# Altium footprint library 10-Diobe.PcbLib: 108 footprints (part 1 of 7)
Each footprint in its own frame and in the unit in brackets; x right, y up, seen from the top. Pads: shape width x height; smd on the part's side, far side on the other; paste and mask are expansions set on the pad; w line width, h text height; cw(c..) or ccw(c..) is an arc to the next point about the centre after c.
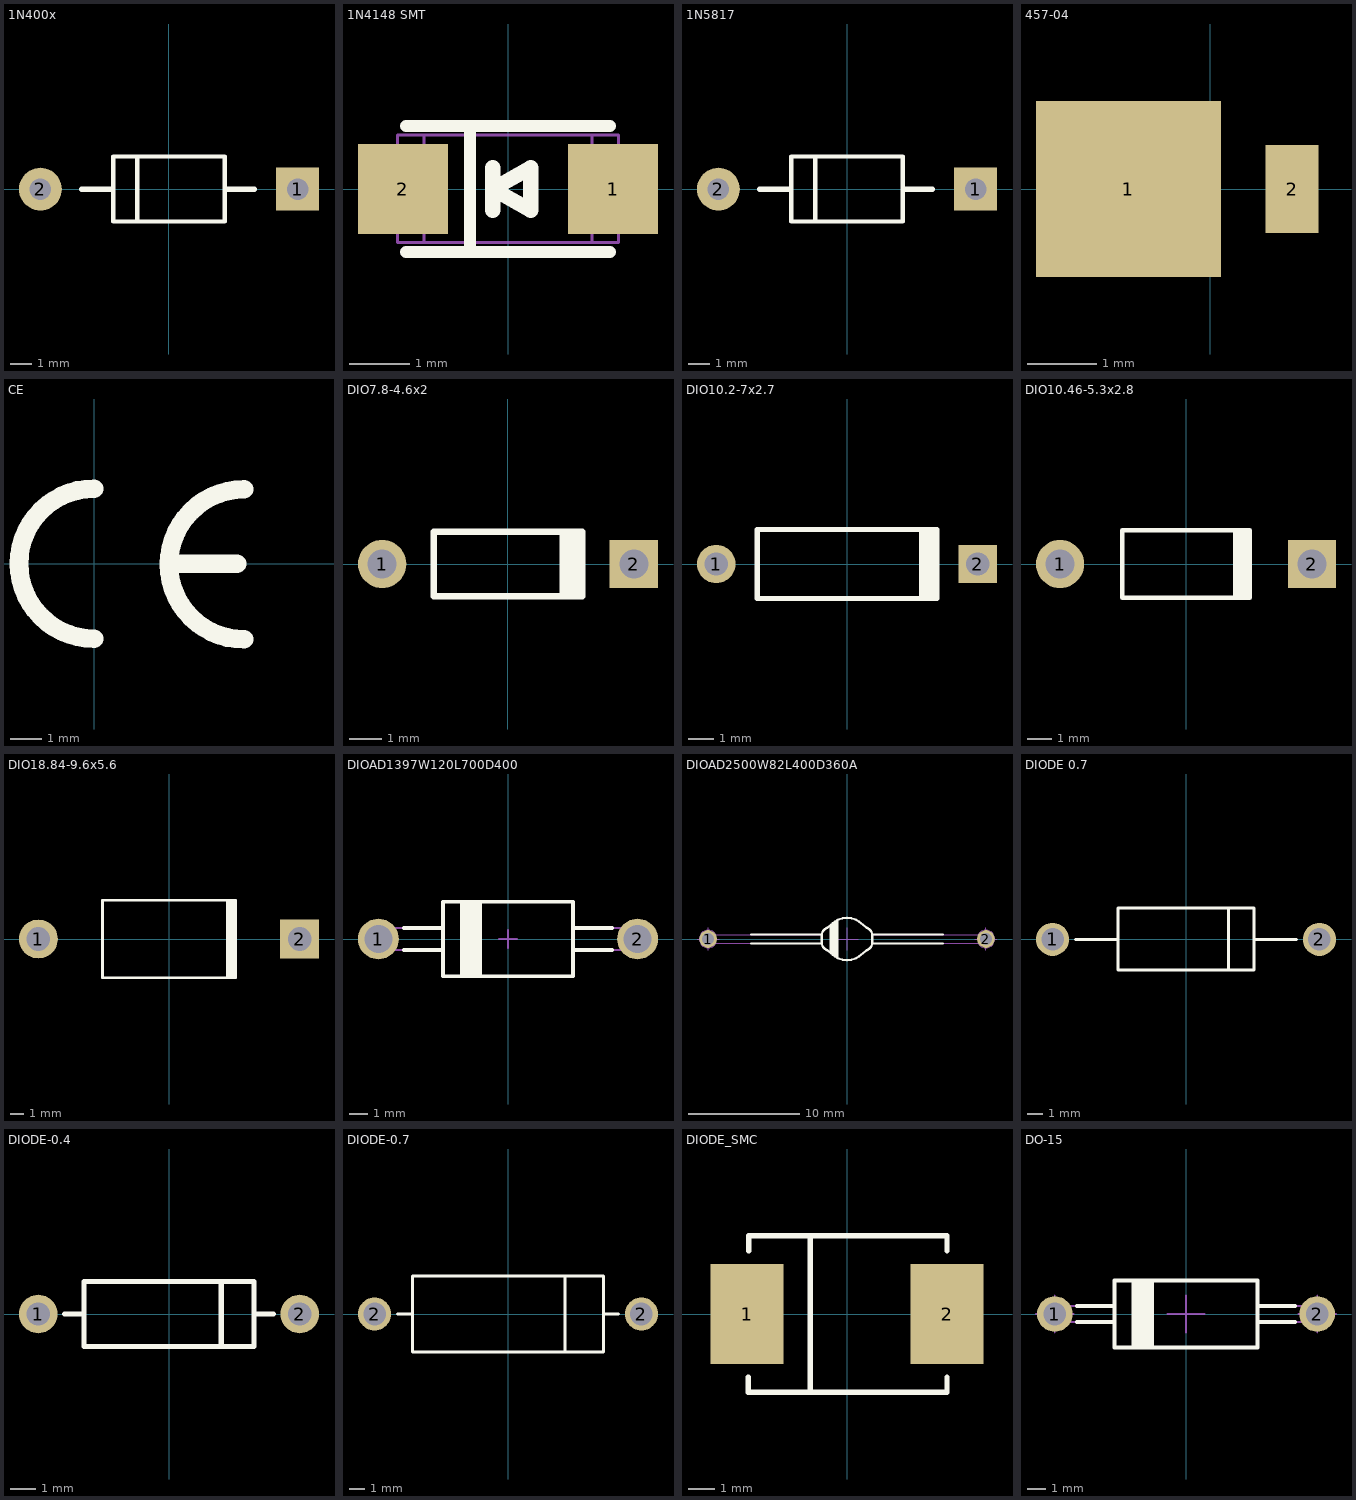
[diagram p0: the footprints below, top view; thin cyan lines are the x and y axes]

## 1N400x [mm]
height 5.98
pads (2):
  rect 2x2 hole 1: 1(6,0)
  round 2 hole 1 mask+0.07: 2(-6,0)
Top Overlay:
  lines w0.2: -1.486,-1.499 -1.486,1.524 ; -2.6,-1.511 -2.6,1.524 2.6,1.524 2.6,-1.511 -2.6,-1.511
  lines w0.254: -4.077,0 -2.654,0 ; 2.616,0 3.975,0
3D body "d12.stp": height 3.01, standoff -1.5, extent -6.5,-1.505 6.5,1.505
3D body "2-2-0_8.stp": height 0.02, standoff -2.02, extent 4.994,-0.978 6.994,1.022
3D body "2-2-0_8.stp": height 0.02, standoff -2.02, extent -6.994,-0.978 -4.994,1.022

## 1N4148 SMT [mm]
height 5.98
pads (2):
  rect 1.5x1.5 smd: 1(1.75,0)
  rect 1.5x1.5 smd mask+0.07: 2(-1.75,0)
Top Overlay:
  lines w0.2: -1.7,-1.05 1.7,-1.05 ; -1.7,1.05 1.7,1.05 ; -0.635,-1.05 -0.635,1.05
  lines w0.254: -0.254,-0.356 -0.254,0 ; -0.254,0.356 -0.254,0 ; -0.254,0 0.381,0.356 0.381,-0.356 -0.254,0
Mechanical 15:
  lines w0.051: -1.397,-0.889 -1.397,0.902 ; 1.397,-0.889 1.397,0.902 ; -1.841,-0.889 1.841,-0.889 1.841,0.902 -1.841,0.902 -1.841,-0.889
3D body "1_5-1_5.stp": height 0.01, standoff 0, extent 1,-0.75 2.5,0.75
3D body "1_5-1_5.stp": height 0.01, standoff 0, extent -2.5,-0.75 -1,0.75
3D body "1n4148-smt.stp": height 1.6, standoff 0, extent -1.8,-0.815 1.8,0.789

## 1N5817 [mm]
height 5.98
pads (2):
  rect 2x2 hole 1: 1(6,0)
  round 2 hole 1 mask+0.07: 2(-6,0)
Top Overlay:
  lines w0.2: -1.486,-1.499 -1.486,1.524 ; -2.6,-1.511 2.6,-1.511 2.6,1.524 -2.6,1.524 -2.6,-1.511
  lines w0.254: -4.077,0 -2.654,0 ; 2.616,0 3.975,0
3D body "2-2-0_8.stp": height 0.02, standoff -2.02, extent -6.994,-0.978 -4.994,1.022
3D body "2-2-0_8.stp": height 0.02, standoff -2.02, extent 4.994,-0.978 6.994,1.022
3D body "d12.stp": height 3.01, standoff -1.5, extent -6.5,-1.505 6.5,1.505

## 457-04 [mil]
height 235.43
pads (2):
  rect 105.12x100 smd: 1(-46.5,0)
  rect 30x50 smd mask+2.76: 2(46.5,0)
3D body "1_27-0_762.stp": height 0.79, standoff 0, extent 31.5,-25 61.5,25
3D body "457-04.stp": height 33.46, standoff 0, extent -87.14,-34.44 48.69,34.45
3D body "2_67-2_54.stp": height 0.79, standoff 0, extent -99.05,-50 6.06,50

## CE [mm]
Top Overlay:
  lines w0.6: 0,-2.413 cw(c0,0) 0,2.413 ; 2.53,0 4.6,0 ; 4.826,-2.438 cw(c4.826,-0.025) 4.826,2.388
3D body "ce.stp": height 0.02, standoff 0, extent -2.725,-2.725 4.82,2.725

## DIO7.8-4.6x2 [mm] "Diode, Axial; Body 4.6 x 1.9 mm (LxDia. max), Lead Dia. 0.53 mm (max)"
height 2
pads (2):
  round 1.5 hole 0.9 mask+0.07: 1(-3.9,0)
  rect 1.5x1.5 hole 0.9 mask+0.07: 2(3.9,0)
Top Overlay:
  rectangle: 1.6,-1 2.4,1
  lines w0.2: 2.3,-1 -2.3,-1 -2.3,1 2.3,1
3D body "v150-090.stp": height 0.02, standoff -1.65, extent -4.65,-0.75 -3.15,0.75
3D body "v150-090.stp": height 0.02, standoff -1.65, extent 3.15,-0.75 4.65,0.75

## DIO10.2-7x2.7 [mm] "Diode, Axial; Body 7 x 2.7 mm (LxDia. max), Lead Dia. 0.53 mm (max)"
height 2.7
pads (2):
  round 1.5 hole 0.9 mask+0.07: 1(-5.1,0)
  rect 1.5x1.5 hole 0.9: 2(5.1,0)
Top Overlay:
  rectangle: 2.8,-1.35 3.6,1.35
  lines w0.2: 3.5,-1.35 -3.5,-1.35 -3.5,1.35 3.5,1.35
3D body "v150-090.stp": height 0.02, standoff -1.65, extent 4.35,-0.75 5.85,0.75
3D body "v150-090.stp": height 0.02, standoff -1.65, extent -5.85,-0.75 -4.35,0.75

## DIO10.46-5.3x2.8 [mm] "Diode, Axial; Body 5.2 x 2.7 mm (LxDia. max), Lead Dia. 0.86 mm (max)"
height 2.8
pads (2):
  round 2 hole 1.2 mask+0.07: 1(-5.23,0)
  rect 2x2 hole 1.2: 2(5.23,0)
Top Overlay:
  rectangle: 1.95,-1.4 2.75,1.4
  lines w0.2: 2.65,-1.4 -2.65,-1.4 -2.65,1.4 2.65,1.4
3D body "v200-120.stp": height 0.02, standoff -1.65, extent -6.23,-1 -4.23,1
3D body "v200-120.stp": height 0.02, standoff -1.65, extent 4.23,-1 6.23,1

## DIO18.84-9.6x5.6 [mm] "Diode, Axial; Body 9.5 x 5.6 mm (LxDia. max), Lead Dia. 1.32 mm (max)"
height 5.6
pads (2):
  round 2.8 hole 1.7: 1(-9.42,0)
  rect 2.8x2.8 hole 1.7 mask+0.07: 2(9.42,0)
Top Overlay:
  rectangle: 4.1,-2.8 4.9,2.8
  lines w0.2: 4.8,-2.8 -4.8,-2.8 -4.8,2.8 4.8,2.8
3D body "v280-170.stp": height 0.02, standoff -1.65, extent 8.02,-1.4 10.82,1.4
3D body "v280-170.stp": height 0.02, standoff -1.65, extent -10.82,-1.4 -8.02,1.4

## DIOAD1397W120L700D400 [mm] "Diode, Axial; Lead Spacing 13.97mm, Lead Dia. 1.20mm, Body Length 7mm, Body Dia. 4mm"
height 4
pads (2):
  round 2.2 hole 1.5: 1(-6.985,0) 2(6.985,0)
Top Overlay:
  lines w0.2: -5.608,-0.595 -3.5,-0.595 ; -5.608,0.595 -3.5,0.595 ; -2.5,-2 -2.5,2 ; -2.389,-2 -2.389,2 ; -2.262,-2 -2.262,2 ; -2.135,-2 -2.135,2 ; -2.008,-2 -2.008,2 ; -1.881,-2 -1.881,2 ; -1.754,-2 -1.754,2 ; -1.627,-2 -1.627,2 ; -1.5,-2 -1.5,2 ; 3.5,-0.595 5.608,-0.595 ; 3.5,0.595 5.608,0.595 ; -3.5,-2 3.5,-2 3.5,2 -3.5,2 -3.5,-2
Mechanical 8:
  lines w0.1: -7.485,0 -6.985,0 ; -6.985,-0.5 -6.985,0 ; -6.985,0.5 -6.985,0 ; -6.485,0 -6.985,0 ; -0.5,0 0,0 ; 0,-0.5 0,0 ; 0,0.5 0,0 ; 0.5,0 0,0 ; 6.485,0 6.985,0 ; 6.985,-0.5 6.985,0 ; 6.985,0.5 6.985,0 ; 7.485,0 6.985,0
Mechanical 14:
  lines w0.1: -3.5,-0.595 -6.985,-0.595 cw(c-6.985,0) -6.985,0.595 -3.5,0.595 ; -2.5,-2 -2.5,2 ; -1.5,-2 -1.5,2 ; 3.5,-0.595 6.985,-0.595 ccw(c6.985,0) 6.985,0.595 3.5,0.595 ; -3.5,-2 3.5,-2 3.5,2 -3.5,2 -3.5,-2
3D body "NTE_NTE506.stp": height 4, standoff -3.6, extent -7.58,-2 7.58,2
3D body "v220-150.stp": height 0.02, standoff -1.65, extent 5.885,-1.1 8.085,1.1
3D body "v220-150.stp": height 0.02, standoff -1.65, extent -8.085,-1.1 -5.885,1.1

## DIOAD2500W82L400D360A [mm] "Diode, Axial; Lead Spacing 25.00mm, Lead Dia. 0.82mm, Body Length 4.00mm, Body Dia. 3.60mm, Standoff Height 1.4mm"
height 4.6
pads (2):
  round 1.6 hole 1.1: 1(-12.5,0) 2(12.5,0)
Top Overlay:
  lines w0.2: -8.621,-0.4 -2.28,-0.4 ; -8.621,0.4 -2.28,0.4 ; -1.474,-1.244 -1.474,1.244 ; -1.274,-1.41 -1.274,1.41 ; -1.074,-1.568 -1.074,1.568 ; -0.874,-1.689 -0.874,1.689 ; 8.621,-0.4 2.28,-0.4 ; 8.621,0.4 2.28,0.4 ; -2.28,-0.4 ccw(c-1.512,-0.28) -1.883,-0.962 cw(c-2.839,-2.719) -1.681,-1.089 cw(c-4.575,-5.166) -1.26,-1.423 ccw(c0,0) -0.92,-1.663 -0.813,-1.723 ccw(c0,0) 0,-1.905 ccw(c0,0) 0.813,-1.723 0.92,-1.663 ccw(c0,0) 1.26,-1.423 cw(c4.575,-5.166) 1.681,-1.089 cw(c2.839,-2.719) 1.883,-0.962 ccw(c1.512,-0.28) 2.28,-0.4 ; -2.28,-0.4 -2.28,0 -2.28,0.4 ; -2.28,0.4 cw(c-1.512,0.28) -1.883,0.962 ccw(c-2.839,2.719) -1.681,1.089 ccw(c-4.575,5.166) -1.26,1.423 cw(c0,0) -0.92,1.663 -0.813,1.723 cw(c0,0) 0,1.905 cw(c0,0) 0.813,1.723 0.92,1.663 cw(c0,0) 1.26,1.423 ccw(c4.575,5.166) 1.681,1.089 ccw(c2.839,2.719) 1.883,0.962 cw(c1.512,0.28) 2.28,0.4 ; 2.28,-0.4 2.28,0 2.28,0.4
Mechanical 8:
  lines w0.1: -13.5,0 -12.5,0 ; -12.5,-1 -12.5,0 ; -12.5,1 -12.5,0 ; -11.5,0 -12.5,0 ; -1,0 0,0 ; 0,-1 0,0 ; 0,1 0,0 ; 1,0 0,0 ; 11.5,0 12.5,0 ; 12.5,-1 12.5,0 ; 12.5,1 12.5,0 ; 13.5,0 12.5,0
Mechanical 14:
  lines w0.1: -12.123,-0.4 cw(c-12.5,0) -12.123,0.4 ; -11.807,-0.4 cw(c-12.5,0) -11.807,0.4 ; -1.474,-1.244 -1.474,1.244 ; -1.274,-1.41 -1.274,1.41 ; -1.074,-1.568 -1.074,1.568 ; -0.874,-1.689 -0.874,1.689 ; 11.807,-0.4 ccw(c12.5,0) 11.807,0.4 ; 12.123,-0.4 ccw(c12.5,0) 12.123,0.4 ; -2.28,-0.4 ccw(c-1.512,-0.28) -1.883,-0.962 cw(c-2.839,-2.719) -1.681,-1.089 cw(c-4.575,-5.166) -1.26,-1.423 ccw(c0,0) -0.92,-1.663 -0.813,-1.723 ccw(c0,0) 0,-1.905 ccw(c0,0) 0.813,-1.723 0.92,-1.663 ccw(c0,0) 1.26,-1.423 cw(c4.575,-5.166) 1.681,-1.089 cw(c2.839,-2.719) 1.883,-0.962 ccw(c1.512,-0.28) 2.28,-0.4 ; -2.28,-0.4 -12.5,-0.4 cw(c-12.5,0) -12.5,0.4 -2.28,0.4 ; -2.28,-0.4 -2.28,0 -2.28,0.4 ; -2.28,0.4 cw(c-1.512,0.28) -1.883,0.962 ccw(c-2.839,2.719) -1.681,1.089 ccw(c-4.575,5.166) -1.26,1.423 cw(c0,0) -0.92,1.663 -0.813,1.723 cw(c0,0) 0,1.905 cw(c0,0) 0.813,1.723 0.92,1.663 cw(c0,0) 1.26,1.423 ccw(c4.575,5.166) 1.681,1.089 ccw(c2.839,2.719) 1.883,0.962 cw(c1.512,0.28) 2.28,0.4 ; 2.28,-0.4 12.5,-0.4 ccw(c12.5,0) 12.5,0.4 2.28,0.4 ; 2.28,-0.4 2.28,0 2.28,0.4
3D body "DIOAD2500W82L400D360H460A.stp": height 4.9, standoff -3, extent -12.9,-1.905 12.9,1.905
3D body "v160-110.stp": height 0.02, standoff -1.65, extent -13.3,-0.8 -11.7,0.8
3D body "v160-110.stp": height 0.02, standoff -1.65, extent 11.7,-0.8 13.3,0.8

## DIODE 0.7 [mm]
height 4.6
pads (2):
  round 2.2 hole 1.5 mask+0.07: 1(-8.89,0) 2(8.89,0)
Top Overlay:
  lines w0.2: -7.366,0 -4.521,0 ; 2.845,-2.032 2.845,2.083 ; 4.521,0 7.366,0 ; -4.521,-2.032 -4.521,2.083 4.521,2.083 4.521,-2.032 -4.521,-2.032
3D body "1n5349.stp": height 3.81, standoff -2.5, extent -9.42,-1.88 9.42,1.932
3D body "v220-150.stp": height 0.02, standoff -1.65, extent -9.99,-1.1 -7.79,1.1
3D body "v220-150.stp": height 0.02, standoff -1.65, extent 7.79,-1.1 9.99,1.1

## DIODE-0.4 [mm] "Diode, Thru-Hole; 2 Leads; 0.4 in Pin Spacing"
height 2.54
pads (2):
  round 1.5 hole 0.9 mask+0.07: 1(-5.08,0)
  round 1.5 hole 0.9: 2(5.08,0)
Top Overlay:
  lines w0.2: -4.064,0 -3.302,0 ; 2.032,-1.27 2.032,1.27 ; 3.302,0 4.064,0 ; -3.302,-1.27 3.302,-1.27 3.302,1.27 -3.302,1.27 -3.302,-1.27
3D body "v150-090.stp": height 0.02, standoff -1.65, extent 4.33,-0.75 5.83,0.75
3D body "v150-090.stp": height 0.02, standoff -1.65, extent -5.83,-0.75 -4.33,0.75

## DIODE-0.7 [mm] "Diode, Thru-Hole; 2 Leads; 0.7 in Pin Spacing"
height 5.08
pads (2):
  round 2.2 hole 1.5: 2(-8.89,0) 2(8.89,0)
Top Overlay:
  lines w0.2: -7.366,0 -6.35,0 ; 3.81,-2.54 3.81,2.54 ; 6.35,0 7.366,0 ; -6.35,-2.54 6.35,-2.54 6.35,2.54 -6.35,2.54 -6.35,-2.54
3D body "v220-150.stp": height 0.02, standoff -1.65, extent 7.79,-1.1 9.99,1.1
3D body "v220-150.stp": height 0.02, standoff -1.65, extent -9.99,-1.1 -7.79,1.1

## DIODE_SMC [mil] "Magnetic-Core Inductor with Winding Polarity Marking; 2 Leads"
height 200
pads (2):
  rect 110x150 smd mask+2.76: 1(-150,0)
  rect 110x150 smd: 2(150,0)
Top Overlay:
  lines w7.87: -148,-95 -148,-117.5 150,-117.5 150,-95 ; -147.5,95 -147.5,117.5 150,117.5 150,95 ; -55,-117 -55,117
3D body "2_794-3_81.stp": height 0.79, standoff 0, extent 95,-74.5 205,75.5
3D body "2_794-3_81.stp": height 0.79, standoff 0, extent -204.5,-75 -94.5,75
3D body "smc_do-214ab.stp": height 78.74, standoff 0, extent -140.04,-110.04 140.04,110.04

## DO-15 [mm] "DO-15, Diode, Axial, Body 7.62 x 3.56mm (LxDia. Max), Pin spacing 13.97mm"
height 3.56
pads (2):
  round 1.9 hole 1.2: 1(-6.985,0) 2(6.985,0)
Top Overlay:
  lines w0.2: -5.8,-0.43 -3.81,-0.43 ; -5.8,0.43 -3.81,0.43 ; -2.81,-1.78 -2.81,1.78 ; -2.71,-1.78 -2.71,1.78 ; -2.61,-1.78 -2.61,1.78 ; -2.51,-1.78 -2.51,1.78 ; -2.31,-1.78 -2.31,1.78 ; -2.21,-1.78 -2.21,1.78 ; -2.11,-1.78 -2.11,1.78 ; -2.01,-1.78 -2.01,1.78 ; -1.91,-1.78 -1.91,1.78 ; -1.81,-1.78 -1.81,1.78 ; 3.81,-0.43 5.8,-0.43 ; 3.81,0.43 5.8,0.43 ; -3.81,-1.78 3.81,-1.78 3.81,1.78 -3.81,1.78 -3.81,-1.78 ; -2.41,-1.78 -2.41,1.78 -2.41,-1.78
Mechanical 8:
  lines w0.1: -7.985,0 -6.985,0 ; -6.985,-1 -6.985,0 ; -6.985,1 -6.985,0 ; -5.985,0 -6.985,0 ; -1,0 0,0 ; 0,-1 0,0 ; 0,1 0,0 ; 1,0 0,0 ; 5.985,0 6.985,0 ; 6.985,-1 6.985,0 ; 6.985,1 6.985,0 ; 7.985,0 6.985,0
Mechanical 14:
  lines w0.1: -3.81,-0.43 -6.985,-0.43 cw(c-6.985,0) -6.985,0.43 -3.81,0.43 ; -2.81,-1.78 -2.81,1.78 ; -2.71,-1.78 -2.71,1.78 ; -2.61,-1.78 -2.61,1.78 ; -2.51,-1.78 -2.51,1.78 ; -2.31,-1.78 -2.31,1.78 ; -2.21,-1.78 -2.21,1.78 ; -2.11,-1.78 -2.11,1.78 ; -2.01,-1.78 -2.01,1.78 ; -1.91,-1.78 -1.91,1.78 ; -1.81,-1.78 -1.81,1.78 ; 3.81,-0.43 6.985,-0.43 ccw(c6.985,0) 6.985,0.43 3.81,0.43 ; -3.81,-1.78 -3.81,1.78 3.81,1.78 3.81,-1.78 -3.81,-1.78 ; -2.41,-1.78 -2.41,1.78 -2.41,-1.78
3D body "DO-15.stp": height 3.56, standoff -3.2, extent -7.415,-1.78 7.415,1.78
3D body "v220-150.stp": height 0.02, standoff -1.65, extent -8.085,-1.1 -5.885,1.1
3D body "v220-150.stp": height 0.02, standoff -1.65, extent 5.885,-1.1 8.085,1.1